# Altium footprint library SYB.PcbLib.PcbLib: 89 footprints (part 3 of 6)
Each footprint in its own frame and in the unit in brackets; x right, y up, seen from the top. Pads: shape width x height; smd on the part's side, far side on the other; paste and mask are expansions set on the pad; w line width, h text height; cw(c..) or ccw(c..) is an arc to the next point about the centre after c.
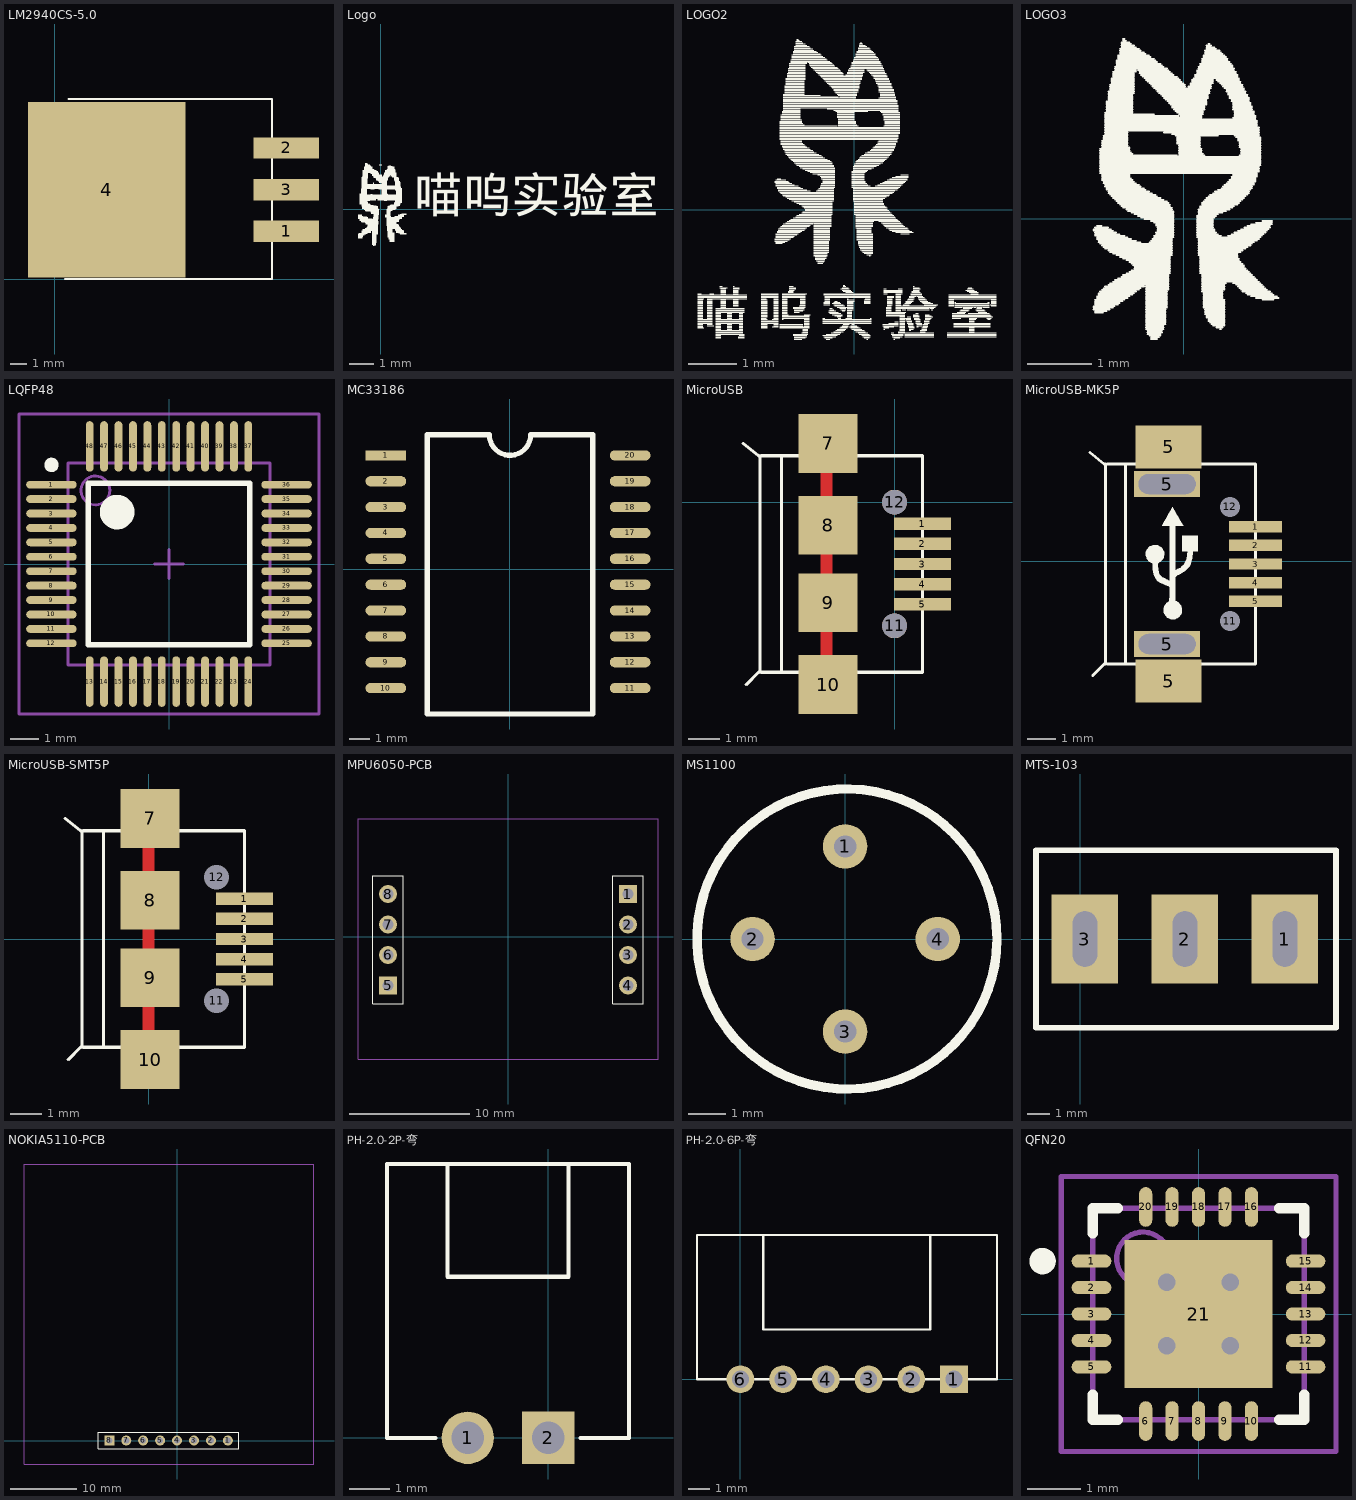
[diagram p2: the footprints below, top view; thin cyan lines are the x and y axes]

## LM2940CS-5.0 [mm] "贴片TO-263"
pads (4):
  rect 4x1.3 smd: 1(14.113,2.921) 2(14.113,8.001) 3(14.113,5.461)
  rect 9.62x10.7 smd: 4(3.167,5.461)
Top Overlay:
  lines w0.127: 0.635,0 13.25,0 13.25,11 0.84,11
3D body: height 4.69, standoff 0, extent -0.457,0.527 14.983,10.687

## Logo [mm] "黑的logo"
Top Overlay:
  drawing of 323 lines, arcs and shapes, not listed
  text "喵呜实验室" at 1.375,-0.625 h2.54

## LOGO2 [mm]
Top Overlay:
  drawing of 956 lines, arcs and shapes, not listed

## LOGO3 [mm]
Top Overlay:
  drawing of 436 lines, arcs and shapes, not listed

## LQFP48 [mm] "LQFP48-STC12C5A60S2"
pads (48):
  oval 1.75x0.27 smd: 1(-4.075,2.75) 2(-4.075,2.25) 3(-4.075,1.75) 4(-4.075,1.25) 5(-4.075,0.75) 6(-4.075,0.25) 7(-4.075,-0.25) 8(-4.075,-0.75) 9(-4.075,-1.25) 10(-4.075,-1.75) 11(-4.075,-2.25) 12(-4.075,-2.75) 25(4.075,-2.75) 26(4.075,-2.25) 27(4.075,-1.75) 28(4.075,-1.25) 29(4.075,-0.75) 30(4.075,-0.25) 31(4.075,0.25) 32(4.075,0.75) 33(4.075,1.25) 34(4.075,1.75) 35(4.075,2.25) 36(4.075,2.75)
  oval 0.27x1.75 smd: 13(-2.75,-4.075) 14(-2.25,-4.075) 15(-1.75,-4.075) 16(-1.25,-4.075) 17(-0.75,-4.075) 18(-0.25,-4.075) 19(0.25,-4.075) 20(0.75,-4.075) 21(1.25,-4.075) 22(1.75,-4.075) 23(2.25,-4.075) 24(2.75,-4.075) 37(2.75,4.075) 38(2.25,4.075) 39(1.75,4.075) 40(1.25,4.075) 41(0.75,4.075) 42(0.25,4.075) 43(-0.25,4.075) 44(-0.75,4.075) 45(-1.25,4.075) 46(-1.75,4.075) 47(-2.25,4.075) 48(-2.75,4.075)
Top Overlay:
  circle w0.25: c-4.075,3.435 r0.125
  circle w0.6: c-1.8,1.8 r0.3
  lines w0.2: -2.8,-2.8 -2.8,2.8 2.8,2.8 2.8,-2.8 -2.8,-2.8
Mechanical 13:
  circle w0.1: c-2.55,2.55 r0.5
  lines w0.1: -3.5,-3.5 -3.5,3.5 3.5,3.5 3.5,-3.5 -3.5,-3.5
Mechanical 15:
  lines w0.1: -0.5,0 0.5,0 ; 0,-0.5 0,0.5 ; -5.2,-5.2 -5.2,5.2 5.2,5.2 5.2,-5.2 -5.2,-5.2
3D body: height 1.5, standoff 0, extent -4.5,-4.5 4.5,4.5

## MC33186 [mm]
pads (20):
  rect 2x0.5 smd: 1(-6.096,5.588)
  oval 2x0.5 smd: 2(-6.096,4.318) 3(-6.096,3.048) 4(-6.096,1.778) 5(-6.096,0.508) 6(-6.096,-0.762) 7(-6.096,-2.032) 8(-6.096,-3.302) 9(-6.096,-4.572) 10(-6.096,-5.842) 11(5.904,-5.842) 12(5.904,-4.572) 13(5.904,-3.302) 14(5.904,-2.032) 15(5.904,-0.762) 16(5.904,0.508) 17(5.904,1.778) 18(5.904,3.048) 19(5.904,4.318) 20(5.904,5.588)
Top Overlay:
  lines w0.254: -4.064,-7.112 -4.064,6.604 -1.016,6.604 ccw(c0,6.604) 1.016,6.604 4.064,6.604 4.064,-7.112 -4.064,-7.112

## MicroUSB [mm] "标准B型-贴片型"
pads (11):
  rect 1.85x0.4 smd: 1(0.9,-0.7) 2(0.9,-1.35) 3(0.9,-2) 4(0.9,-2.65) 5(0.9,-3.3)
  rect 1.9x1.9 smd: 7(-2.15,1.9) 8(-2.15,-0.75) 9(-2.15,-3.25) 10(-2.15,-5.9)
  round 0.8 hole 0.8: 11(0,-4) 12(0,0)
Top Layer:
  lines w0.4: -2.2,-6 -2.2,2
Top Overlay:
  lines w0.1: -4.9,1.9 -4.4,1.5 ; -4.8,-5.9 -4.4,-5.5 ; -4.35,-5.5 -4.35,1.5 ; -4.3,-5.5 0.9,-5.5 0.9,1.5 -4.3,1.5 ; -3.65,-5.5 -3.65,1.5
3D body: height 2.67, standoff -0.27, extent -4.53,-6 0.9,1.98

## MicroUSB-MK5P [mm]
pads (11):
  rect 1.85x0.4 smd: 1(9.6,1.2) 2(9.6,0.55) 3(9.6,-0.1) 4(9.6,-0.75) 5(9.6,-1.4)
  rect 2.3x0.9 hole 0.7 slot 2 at 0 deg: 5(6.5,-2.9) 5(6.5,2.7)
  rect 2.3x1.5 smd: 5(6.55,-4.2) 5(6.55,4)
  round 0.6 hole 0.7: 11(8.7,-2.1) 12(8.7,1.9)
Top Overlay:
  drawing of 8 lines, arcs and shapes, not listed
3D body: height 2.67, standoff -0.27, extent 4.17,-4.1 9.6,3.88

## MicroUSB-SMT5P [mm]
pads (11):
  rect 1.85x0.4 smd: 1(3.1,1.3) 2(3.1,0.65) 3(3.1,0) 4(3.1,-0.65) 5(3.1,-1.3)
  rect 1.9x1.9 smd: 7(0.05,3.9) 8(0.05,1.25) 9(0.05,-1.25) 10(0.05,-3.9)
  round 0.6 hole 0.8: 11(2.2,-2) 12(2.2,2)
Top Layer:
  lines w0.4: 0,-4 0,4
Top Overlay:
  lines w0.1: -2.7,3.9 -2.2,3.5 ; -2.6,-3.9 -2.2,-3.5 ; -2.15,-3.5 -2.15,3.5 ; -2.1,-3.5 3.1,-3.5 3.1,3.5 -2.1,3.5 ; -1.45,-3.5 -1.45,3.5
3D body: height 2.67, standoff -0.27, extent -2.33,-4 3.1,3.98

## MPU6050-PCB [mm]
pads (8):
  rect 1.5x1.5 hole 0.9 unplated: 1(10,3.58) 5(-10,-4.04)
  round 1.5 hole 0.9 unplated: 2(10,1.04) 3(10,-1.5) 4(10,-4.04) 6(-10,-1.5) 7(-10,1.04) 8(-10,3.58)
Top Overlay:
  lines w0.1: -11.27,-5.564 -8.73,-5.564 -8.73,5.104 -11.27,5.104 -11.27,-5.564 ; 8.73,-5.564 8.73,5.104 11.27,5.104 11.27,-5.564 8.73,-5.564
Mechanical 1:
  lines w0.1: -12.5,-10.168 12.5,-10.168 12.5,9.832 -12.5,9.832 -12.5,-10.168

## MS1100 [mm]
pads (4):
  round 1.2 hole 0.6: 1(0,2.5) 2(-2.5,0) 3(0,-2.5) 4(2.5,0)
Top Overlay:
  circle w0.254: c0.05,0 r4.05

## MTS-103 [mm]
pads (3):
  rect 3x4 hole 1.1 slot 2.5 at 90 deg: 1(9.2,0) 2(4.7,0) 3(0.2,0)
Top Overlay:
  lines w0.254: -2,-4 11.5,-4 11.5,4 -2,4 -2,-4

## NOKIA5110-PCB [mm] "育松NOKIA5110"
pads (8):
  round 1.5 hole 0.9: 1(7.58,0.025) 2(5.04,0.025) 3(2.5,0.025) 4(-0.04,0.025) 5(-2.58,0.025) 6(-5.12,0.025) 7(-7.66,0.025)
  rect 1.5x1.5 hole 0.9: 8(-10.2,0.025)
Top Overlay:
  lines w0.127: -11.851,-1.245 9.231,-1.245 9.231,1.295 -11.851,1.295 -11.851,-1.245
Mechanical 1:
  lines w0.1: -23,-3.5 -23,41.5 20.5,41.5 20.5,-3.5 -23,-3.5

## PH-2.0-2P-弯 [mm]
pads (2):
  round 1.3 hole 0.8: 1(-2,0)
  rect 1.3x1.3 hole 0.8: 2(0,0)
Top Overlay:
  lines w0.1: -4,6.762 -4,0 -2.8,0 ; -4,6.8 2,6.8 ; -2.5,6.8 -2.5,4 0.5,4 0.5,6.8 ; 0.8,0 2,0 2,6.762

## PH-2.0-6P-弯 [mm] "2.0防呆弯脚插座"
height 4.7
pads (6):
  rect 1.3x1.3 hole 0.8: 1(10,0)
  round 1.3 hole 0.8: 2(8,0) 3(6,0) 4(4,0) 5(2,0) 6(0,0)
Top Overlay:
  lines w0.1: -2.032,0 -2.032,6.762 ; -2.032,6.756 12.014,6.756 ; -2,0 12,0 ; 1.067,6.731 1.067,2.337 8.89,2.337 8.89,6.756 ; 12.014,0 12.014,6.762
3D body: height 4.7, standoff 4, extent 10.643,2.946 11.836,4.521
3D body: height 4.7, standoff 4, extent -1.829,3.175 -0.635,4.75
3D body: height 1, standoff 0, extent -2.082,-0.05 12.064,6.812
3D body: height 3, standoff 2, extent -0.356,-0.508 0.356,6.68
3D body: height 3, standoff 0, extent -0.356,-0.483 0.356,0.533
3D body: height 3, standoff 2, extent 1.651,-0.483 2.362,6.706
3D body: height 3, standoff 2, extent 3.632,-0.483 4.343,6.706
3D body: height 3, standoff 2, extent 5.639,-0.457 6.35,6.731
3D body: height 3, standoff 2, extent 7.671,-0.559 8.382,6.629
3D body: height 3, standoff 2, extent 9.601,-0.559 10.312,6.629
3D body: height 3, standoff 0, extent 1.651,-0.483 2.362,0.533
3D body: height 3, standoff 0, extent 3.632,-0.559 4.343,0.457
3D body: height 3, standoff 0, extent 5.639,-0.533 6.35,0.483
3D body: height 3, standoff 0, extent 7.62,-0.483 8.331,0.533
3D body: height 3, standoff 0, extent 9.652,-0.457 10.363,0.559
3D body: height 4.7, standoff 4, extent -2.032,0.025 0.991,6.756
3D body: height 4.7, standoff 4, extent 8.941,0.025 11.938,6.731

## QFN20 [mm]
height 0.9
pads (21):
  oval 0.75x0.25 smd: 1(-2.025,1) 2(-2.025,0.5) 3(-2.025,0) 4(-2.025,-0.5) 5(-2.025,-1) 11(2.025,-1) 12(2.025,-0.5) 13(2.025,0) 14(2.025,0.5) 15(2.025,1)
  oval 0.25x0.75 smd: 6(-1,-2.025) 7(-0.5,-2.025) 8(0,-2.025) 9(0.5,-2.025) 10(1,-2.025) 16(1,2.025) 17(0.5,2.025) 18(0,2.025) 19(-0.5,2.025) 20(-1,2.025)
  rect 2.8x2.8 smd: 21(0,0)
via -0.6,0.6 diameter 0.66 hole 0.33
via 0.6,0.6 diameter 0.66 hole 0.33
via -0.6,-0.6 diameter 0.66 hole 0.33
via 0.6,-0.6 diameter 0.66 hole 0.33
Top Overlay:
  circle w0.25: c-2.95,1 r0.125
  lines w0.2: -2,-1.525 -2,-2 -1.525,-2 ; -2,1.525 -2,2 -1.525,2 ; 1.525,-2 2,-2 2,-1.525 ; 1.525,2 2,2 2,1.525
Mechanical 13:
  circle w0.1: c-1.05,1.05 r0.5
  lines w0.1: -2,-2 -2,2 2,2 2,-2 -2,-2
Mechanical 15:
  lines w0.1: -0.5,0 0.5,0 ; 0,-0.5 0,0.5 ; -2.6,-2.6 -2.6,2.6 2.6,2.6 2.6,-2.6 -2.6,-2.6
3D body: height 0.9, standoff 0.02, extent -2,-2 2,2